# Altium footprint library XU-GENARAL PCB .PcbLib: 1176 footprints (part 37 of 75)
Each footprint in its own frame and in the unit in brackets; x right, y up, seen from the top. Pads: shape width x height; smd on the part's side, far side on the other; paste and mask are expansions set on the pad; w line width, h text height; cw(c..) or ccw(c..) is an arc to the next point about the centre after c.
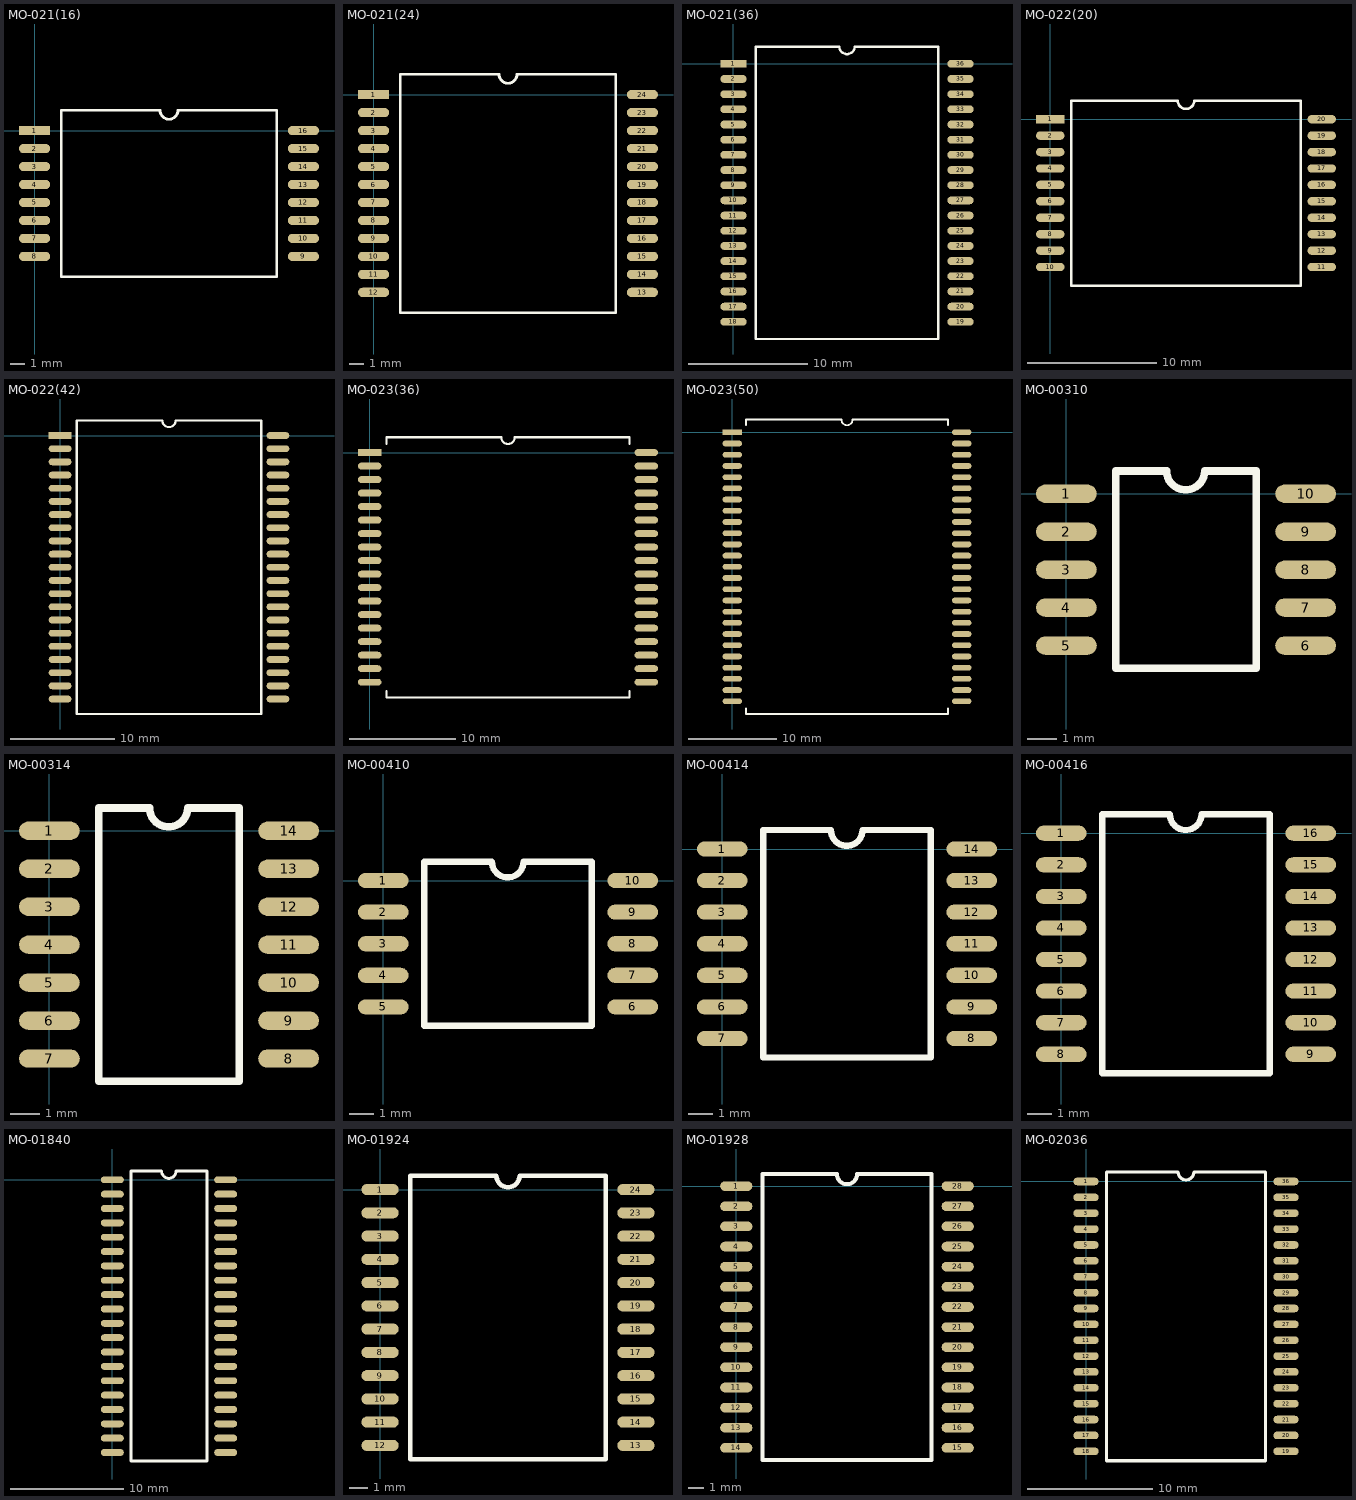
[diagram p36: the footprints below, top view; thin cyan lines are the x and y axes]

## MO-021(16) [mm]
pads (16):
  rect 2.2x0.65 smd: 1(0,0)
  oval 2.2x0.65 smd: 2(0,-1.27) 3(0,-2.54) 4(0,-3.81) 5(0,-5.08) 6(0,-6.35) 7(0,-7.62) 8(0,-8.89) 9(19,-8.89) 10(19,-7.62) 11(19,-6.35) 12(19,-5.08) 13(19,-3.81) 14(19,-2.54) 15(19,-1.27) 16(19,0)
Top Overlay:
  lines w0.2: 1.88,-10.33 17.12,-10.33 17.12,-4.445 17.12,1.44 10.135,1.44 cw(c9.5,1.44) 8.865,1.44 1.88,1.44 1.88,-4.445 1.88,-10.33

## MO-021(24) [mm]
pads (24):
  rect 2.2x0.65 smd: 1(0,0)
  oval 2.2x0.65 smd: 2(0,-1.27) 3(0,-2.54) 4(0,-3.81) 5(0,-5.08) 6(0,-6.35) 7(0,-7.62) 8(0,-8.89) 9(0,-10.16) 10(0,-11.43) 11(0,-12.7) 12(0,-13.97) 13(19,-13.97) 14(19,-12.7) 15(19,-11.43) 16(19,-10.16) 17(19,-8.89) 18(19,-7.62) 19(19,-6.35) 20(19,-5.08) 21(19,-3.81) 22(19,-2.54) 23(19,-1.27) 24(19,0)
Top Overlay:
  lines w0.2: 1.88,-15.41 1.88,-6.985 1.88,1.44 8.865,1.44 ccw(c9.5,1.44) 10.135,1.44 17.12,1.44 17.12,-6.985 17.12,-15.41 1.88,-15.41

## MO-021(36) [mm]
pads (36):
  rect 2.2x0.65 smd: 1(0,0)
  oval 2.2x0.65 smd: 2(0,-1.27) 3(0,-2.54) 4(0,-3.81) 5(0,-5.08) 6(0,-6.35) 7(0,-7.62) 8(0,-8.89) 9(0,-10.16) 10(0,-11.43) 11(0,-12.7) 12(0,-13.97) 13(0,-15.24) 14(0,-16.51) 15(0,-17.78) 16(0,-19.05) 17(0,-20.32) 18(0,-21.59) 19(19,-21.59) 20(19,-20.32) 21(19,-19.05) 22(19,-17.78) 23(19,-16.51) 24(19,-15.24) 25(19,-13.97) 26(19,-12.7) 27(19,-11.43) 28(19,-10.16) 29(19,-8.89) 30(19,-7.62) 31(19,-6.35) 32(19,-5.08) 33(19,-3.81) 34(19,-2.54) 35(19,-1.27) 36(19,0)
Top Overlay:
  lines w0.2: 1.88,-23.03 1.88,-10.795 1.88,1.44 8.865,1.44 ccw(c9.5,1.44) 10.135,1.44 17.12,1.44 17.12,-10.795 17.12,-23.03 1.88,-23.03

## MO-022(20) [mm]
pads (20):
  rect 2.2x0.65 smd: 1(0,0)
  oval 2.2x0.65 smd: 2(0,-1.27) 3(0,-2.54) 4(0,-3.81) 5(0,-5.08) 6(0,-6.35) 7(0,-7.62) 8(0,-8.89) 9(0,-10.16) 10(0,-11.43) 11(21,-11.43) 12(21,-10.16) 13(21,-8.89) 14(21,-7.62) 15(21,-6.35) 16(21,-5.08) 17(21,-3.81) 18(21,-2.54) 19(21,-1.27) 20(21,0)
Top Overlay:
  lines w0.2: 1.61,-12.87 19.39,-12.87 19.39,-5.715 19.39,1.44 11.135,1.44 cw(c10.5,1.44) 9.865,1.44 1.61,1.44 1.61,-5.715 1.61,-12.87

## MO-022(42) [mm]
pads (42):
  rect 2.2x0.65 smd: 1(0,0)
  oval 2.2x0.65 smd: 2(0,-1.27) 3(0,-2.54) 4(0,-3.81) 5(0,-5.08) 6(0,-6.35) 7(0,-7.62) 8(0,-8.89) 9(0,-10.16) 10(0,-11.43) 11(0,-12.7) 12(0,-13.97) 13(0,-15.24) 14(0,-16.51) 15(0,-17.78) 16(0,-19.05) 17(0,-20.32) 18(0,-21.59) 19(0,-22.86) 20(0,-24.13) 21(0,-25.4) 22(21,-25.4) 23(21,-24.13) 24(21,-22.86) 25(21,-21.59) 26(21,-20.32) 27(21,-19.05) 28(21,-17.78) 29(21,-16.51) 30(21,-15.24) 31(21,-13.97) 32(21,-12.7) 33(21,-11.43) 34(21,-10.16) 35(21,-8.89) 36(21,-7.62) 37(21,-6.35) 38(21,-5.08) 39(21,-3.81) 40(21,-2.54) 41(21,-1.27) 42(21,0)
Top Overlay:
  lines w0.2: 1.61,-26.84 19.39,-26.84 19.39,-12.7 19.39,1.44 11.135,1.44 cw(c10.5,1.44) 9.865,1.44 1.61,1.44 1.61,-12.7 1.61,-26.84

## MO-023(36) [mm]
pads (36):
  rect 2.2x0.65 smd: 1(0,0)
  oval 2.2x0.65 smd: 2(0,-1.27) 3(0,-2.54) 4(0,-3.81) 5(0,-5.08) 6(0,-6.35) 7(0,-7.62) 8(0,-8.89) 9(0,-10.16) 10(0,-11.43) 11(0,-12.7) 12(0,-13.97) 13(0,-15.24) 14(0,-16.51) 15(0,-17.78) 16(0,-19.05) 17(0,-20.32) 18(0,-21.59) 19(26,-21.59) 20(26,-20.32) 21(26,-19.05) 22(26,-17.78) 23(26,-16.51) 24(26,-15.24) 25(26,-13.97) 26(26,-12.7) 27(26,-11.43) 28(26,-10.16) 29(26,-8.89) 30(26,-7.62) 31(26,-6.35) 32(26,-5.08) 33(26,-3.81) 34(26,-2.54) 35(26,-1.27) 36(26,0)
Top Overlay:
  lines w0.2: 1.57,-22.415 1.57,-23.03 24.43,-23.03 24.43,-22.415 ; 1.57,0.825 1.57,1.44 12.365,1.44 ccw(c13,1.44) 13.635,1.44 24.43,1.44 24.43,0.825

## MO-023(50) [mm]
pads (50):
  rect 2.2x0.65 smd: 1(0,0)
  oval 2.2x0.65 smd: 2(0,-1.27) 3(0,-2.54) 4(0,-3.81) 5(0,-5.08) 6(0,-6.35) 7(0,-7.62) 8(0,-8.89) 9(0,-10.16) 10(0,-11.43) 11(0,-12.7) 12(0,-13.97) 13(0,-15.24) 14(0,-16.51) 15(0,-17.78) 16(0,-19.05) 17(0,-20.32) 18(0,-21.59) 19(0,-22.86) 20(0,-24.13) 21(0,-25.4) 22(0,-26.67) 23(0,-27.94) 24(0,-29.21) 25(0,-30.48) 26(26,-30.48) 27(26,-29.21) 28(26,-27.94) 29(26,-26.67) 30(26,-25.4) 31(26,-24.13) 32(26,-22.86) 33(26,-21.59) 34(26,-20.32) 35(26,-19.05) 36(26,-17.78) 37(26,-16.51) 38(26,-15.24) 39(26,-13.97) 40(26,-12.7) 41(26,-11.43) 42(26,-10.16) 43(26,-8.89) 44(26,-7.62) 45(26,-6.35) 46(26,-5.08) 47(26,-3.81) 48(26,-2.54) 49(26,-1.27) 50(26,0)
Top Overlay:
  lines w0.2: 1.57,-31.305 1.57,-31.92 24.43,-31.92 24.43,-31.305 ; 1.57,0.825 1.57,1.44 12.365,1.44 ccw(c13,1.44) 13.635,1.44 24.43,1.44 24.43,0.825

## MO-00310 [mil]
pads (10):
  oval 80x24 smd: 1(0,0) 2(0,-50) 3(0,-100) 4(0,-150) 5(0,-200) 6(315,-200) 7(315,-150) 8(315,-100) 9(315,-50) 10(315,0)
Top Overlay:
  lines w10: 65,-230 250,-230 250,30 182,30 cw(c157,30) 132,30 65,30 65,-230

## MO-00314 [mil]
pads (14):
  oval 80x24 smd: 1(0,0) 2(0,-50) 3(0,-100) 4(0,-150) 5(0,-200) 6(0,-250) 7(0,-300) 8(315,-300) 9(315,-250) 10(315,-200) 11(315,-150) 12(315,-100) 13(315,-50) 14(315,0)
Top Overlay:
  lines w10: 65,-330 250,-330 250,30 182,30 cw(c157,30) 132,30 65,30 65,-330

## MO-00410 [mil]
pads (10):
  oval 80x24 smd: 1(0,0) 2(0,-50) 3(0,-100) 4(0,-150) 5(0,-200) 6(395,-200) 7(395,-150) 8(395,-100) 9(395,-50) 10(395,0)
Top Overlay:
  lines w10: 65,-230 65,30 172,30 ccw(c197,30) 222,30 330,30 330,-230 65,-230

## MO-00414 [mil]
pads (14):
  oval 80x24 smd: 1(0,0) 2(0,-50) 3(0,-100) 4(0,-150) 5(0,-200) 6(0,-250) 7(0,-300) 8(395,-300) 9(395,-250) 10(395,-200) 11(395,-150) 12(395,-100) 13(395,-50) 14(395,0)
Top Overlay:
  lines w10: 65,-330 65,30 172,30 ccw(c197,30) 222,30 330,30 330,-330 65,-330

## MO-00416 [mil]
pads (16):
  oval 80x24 smd: 1(0,0) 2(0,-50) 3(0,-100) 4(0,-150) 5(0,-200) 6(0,-250) 7(0,-300) 8(0,-350) 9(395,-350) 10(395,-300) 11(395,-250) 12(395,-200) 13(395,-150) 14(395,-100) 15(395,-50) 16(395,0)
Top Overlay:
  lines w10: 65,-380 65,30 172,30 ccw(c197,30) 222,30 330,30 330,-380 65,-380

## MO-01840 [mil]
pads (40):
  oval 80x24 smd: 1(0,0) 2(0,-50) 3(0,-100) 4(0,-150) 5(0,-200) 6(0,-250) 7(0,-300) 8(0,-350) 9(0,-400) 10(0,-450) 11(0,-500) 12(0,-550) 13(0,-600) 14(0,-650) 15(0,-700) 16(0,-750) 17(0,-800) 18(0,-850) 19(0,-900) 20(0,-950) 21(395,-950) 22(395,-900) 23(395,-850) 24(395,-800) 25(395,-750) 26(395,-700) 27(395,-650) 28(395,-600) 29(395,-550) 30(395,-500) 31(395,-450) 32(395,-400) 33(395,-350) 34(395,-300) 35(395,-250) 36(395,-200) 37(395,-150) 38(395,-100) 39(395,-50) 40(395,0)
Top Overlay:
  lines w10: 65,-980 330,-980 330,30 222,30 cw(c197,30) 172,30 65,30 65,-980

## MO-01924 [mil]
pads (24):
  oval 80x24 smd: 1(0,0) 2(0,-50) 3(0,-100) 4(0,-150) 5(0,-200) 6(0,-250) 7(0,-300) 8(0,-350) 9(0,-400) 10(0,-450) 11(0,-500) 12(0,-550) 13(550,-550) 14(550,-500) 15(550,-450) 16(550,-400) 17(550,-350) 18(550,-300) 19(550,-250) 20(550,-200) 21(550,-150) 22(550,-100) 23(550,-50) 24(550,0)
Top Overlay:
  lines w10: 65,-580 485,-580 485,30 300,30 cw(c275,30) 250,30 65,30 65,-580

## MO-01928 [mil]
pads (28):
  oval 80x24 smd: 1(0,0) 2(0,-50) 3(0,-100) 4(0,-150) 5(0,-200) 6(0,-250) 7(0,-300) 8(0,-350) 9(0,-400) 10(0,-450) 11(0,-500) 12(0,-550) 13(0,-600) 14(0,-650) 15(550,-650) 16(550,-600) 17(550,-550) 18(550,-500) 19(550,-450) 20(550,-400) 21(550,-350) 22(550,-300) 23(550,-250) 24(550,-200) 25(550,-150) 26(550,-100) 27(550,-50) 28(550,0)
Top Overlay:
  lines w10: 65,-680 65,30 250,30 ccw(c275,30) 300,30 485,30 485,-680 65,-680

## MO-02036 [mil]
pads (36):
  oval 80x24 smd: 1(0,0) 2(0,-50) 3(0,-100) 4(0,-150) 5(0,-200) 6(0,-250) 7(0,-300) 8(0,-350) 9(0,-400) 10(0,-450) 11(0,-500) 12(0,-550) 13(0,-600) 14(0,-650) 15(0,-700) 16(0,-750) 17(0,-800) 18(0,-850) 19(630,-850) 20(630,-800) 21(630,-750) 22(630,-700) 23(630,-650) 24(630,-600) 25(630,-550) 26(630,-500) 27(630,-450) 28(630,-400) 29(630,-350) 30(630,-300) 31(630,-250) 32(630,-200) 33(630,-150) 34(630,-100) 35(630,-50) 36(630,0)
Top Overlay:
  lines w10: 65,-880 65,30 290,30 ccw(c315,30) 340,30 565,30 565,-880 65,-880